# Altium integrated library 刘兴达Lib.IntLib: 614 symbols (part 1 of 4) (continued)
## EE-SX3081 (continued)
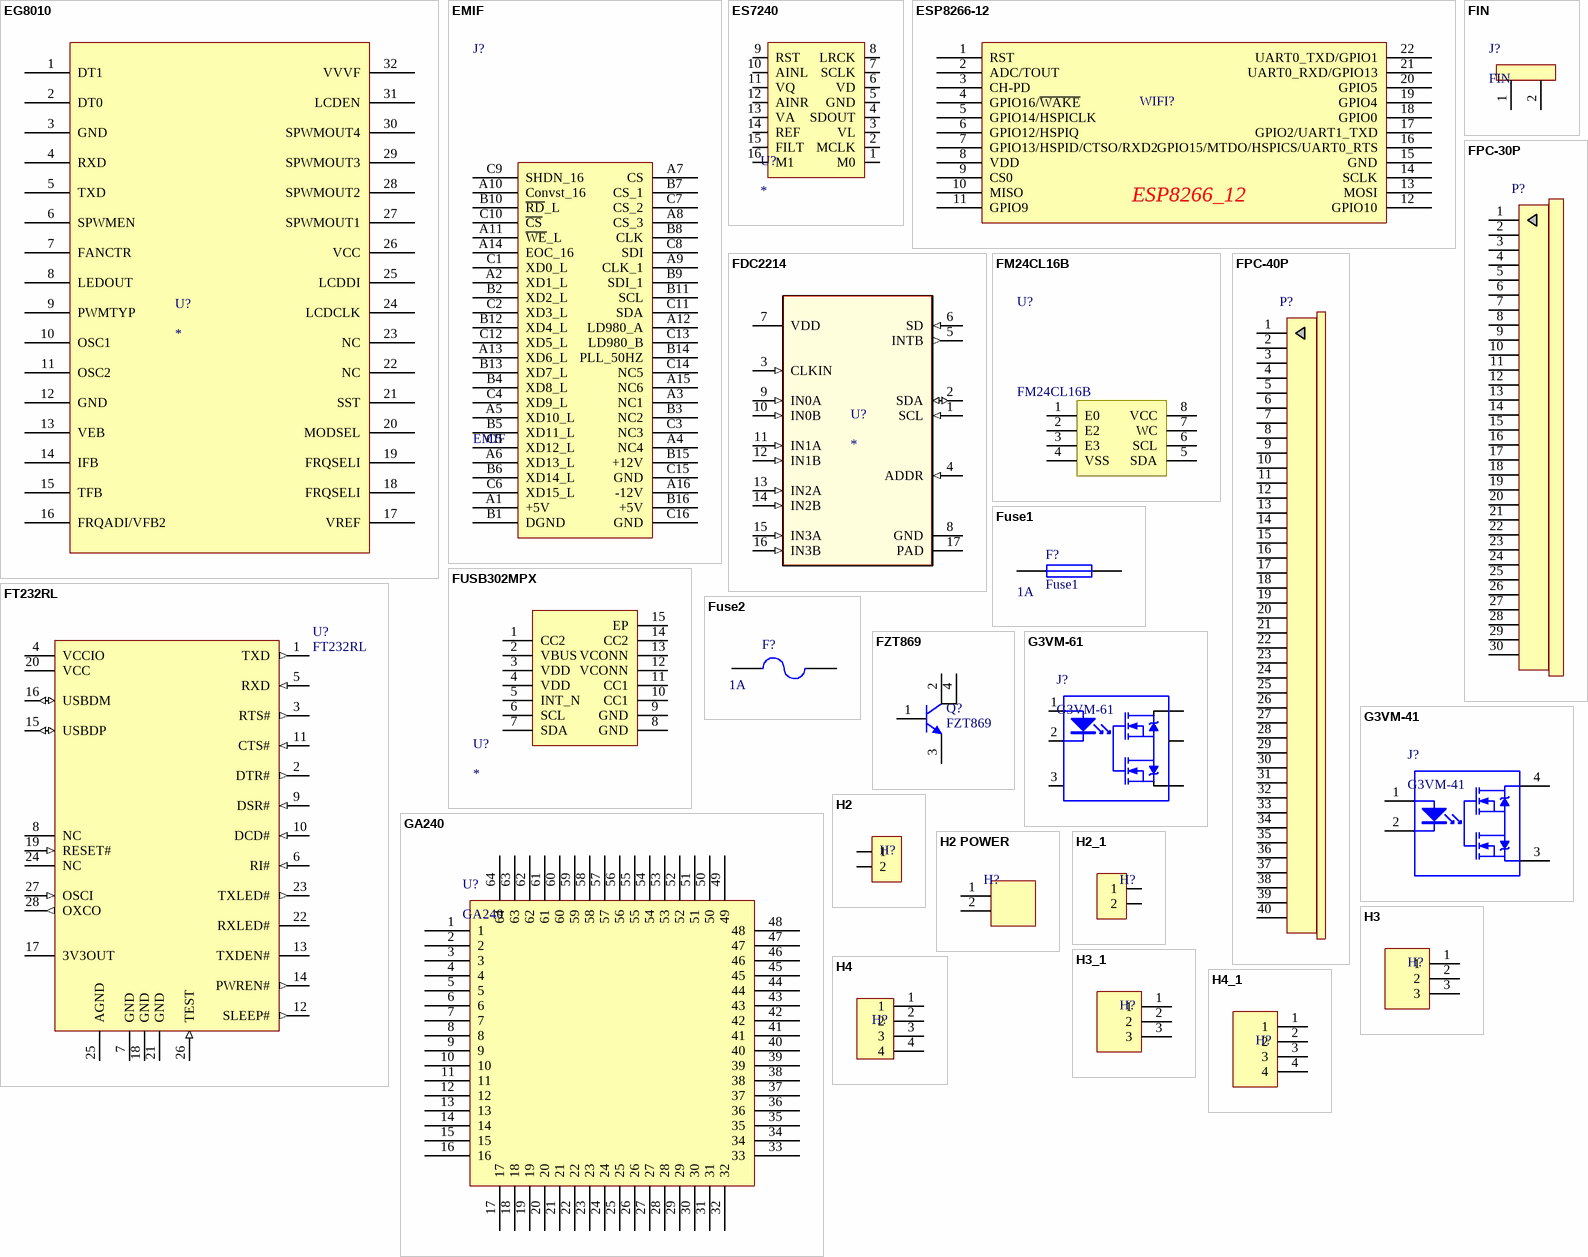
[diagram p6: symbols EG8010 to H4_1]

## EG8010
designator U?
单相逆变器控制器
footprint LQFP-32
pins: 1 DT1, 2 DT0, 3 GND, 4 RXD, 5 TXD, 6 SPWMEN, 7 FANCTR, 8 LEDOUT, 9 PWMTYP, 10 OSC1, 11 OSC2, 12 GND, 13 VEB, 14 IFB, 15 TFB, 16 FRQADI/VFB2, 17 VREF, 18 FRQSELI, 19 FRQSELI, 20 MODSEL, 21 SST, 22 NC, 23 NC, 24 LCDCLK, 25 LCDDI, 26 VCC, 27 SPWMOUT1, 28 SPWMOUT2, 29 SPWMOUT3, 30 SPWMOUT4, 31 LCDEN, 32 VVVF

## EMIF
designator J?
接插件
footprint HDR16X3_HA
footprint HDR16X3_HB
pins: A1 +5V, A2 XD1_L, A3 NC1, A4 NC4, A5 XD10_L, A6 XD13_L, A7 CS, A8 CS_3, A9 CLK_1, A10 Convst_16, A11 ~{WE}_L, A12 LD980_A, A13 XD6_L, A14 EOC_16, A15 NC6, A16 -12V, B1 DGND, B2 XD2_L, B3 NC2, B4 XD8_L, B5 XD11_L, B6 XD14_L, B7 CS_1, B8 CLK, B9 SDI_1, B10 ~{RD}_L, B11 SCL, B12 XD4_L, B13 XD7_L, B14 PLL_50HZ, B15 +12V, B16 +5V, C1 XD0_L, C2 XD3_L, C3 NC3, C4 XD9_L, C5 XD12_L, C6 XD15_L, C7 CS_2, C8 SDI, C9 SHDN_16, C10 ~{CS}, C11 SDA, C12 XD5_L, C13 LD980_B, C14 NC5, C15 GND, C16 GND

## ES7240
designator U?
音频解码芯片
footprint TSSOP-16 (TSOP, 16-Leads, Body 5x4.4mm, Pitch 0.65mm, IPC Low Density)
pins: 1 M0, 2 MCLK, 3 VL, 4 SDOUT, 5 GND, 6 VD, 7 SCLK, 8 LRCK, 9 RST, 10 AINL, 11 VQ, 12 AINR, 13 VA, 14 REF, 15 FILT, 16 M1

## ESP8266-12
designator WIFI?  (value not drawn)
footprint ESP8266-12
pins: 1 RST, 2 ADC/TOUT, 3 CH-PD, 4 GPIO16/~{WAKE}, 5 GPIO14/HSPICLK, 6 GPIO12/HSPIQ, 7 GPIO13/HSPID/CTSO/RXD2, 8 VDD, 9 CS0, 10 MISO, 11 GPIO9, 12 GPIO10, 13 MOSI, 14 SCLK, 15 GND, 16 GPIO15/MTDO/HSPICS/UART0_RTS, 17 GPIO2/UART1_TXD, 18 GPIO0, 19 GPIO4, 20 GPIO5, 21 UART0_RXD/GPIO13, 22 UART0_TXD/GPIO1
text: ESP8266_12

## FDC2214
designator U?
电容测量; PartNumber: FDC2214RGHR; Manufacturer: Texas Instruments; CompType: IC; PIN_COUNT: 17; Application_BuildNumber: *; Alternate_PartNumber: FDC2214RGHR; PackageReference: RGH0016A; MountType: SMT; RoHS: Y; RefDes: RefDes; TYPE: TYPE; Value: Value
footprint WQFN-16
pins: 1 SCL (in), 2 SDA (io), 3 CLKIN (in), 4 ADDR (in), 5 INTB (out), 6 SD (in), 7 VDD (power), 8 GND (power), 9 IN0A (in), 10 IN0B (in), 11 IN1A (in), 12 IN1B (in), 13 IN2A (in), 14 IN2B (in), 15 IN3A (in), 16 IN3B (in), 17 PAD (power)

## FIN
designator J?
散热片
footprint FIN-P2
pins: 1, 2

## FM24CL16B
designator U?
铁电存储器
footprint SOIC-8
pins: 1 E0, 2 E2, 3 E3, 4 VSS, 5 SDA, 6 SCL, 7 WC, 8 VCC

## FPC-30P
designator P?, comment FPC  (value not drawn)
FPC排线连接器
footprint FPC0.8-30P-A (FPC0.8mm接口)
pins: 1, 2, 3, 4, 5, 6, 7, 8, 9, 10, 11, 12, 13, 14, 15, 16, 17, 18, 19, 20, 21, 22, 23, 24, 25, 26, 27, 28, 29, 30

## FPC-40P
designator P?, comment FPC  (value not drawn)
FPC排线连接器
footprint FPC0.5-40P-A
pins: 1, 2, 3, 4, 5, 6, 7, 8, 9, 10, 11, 12, 13, 14, 15, 16, 17, 18, 19, 20, 21, 22, 23, 24, 25, 26, 27, 28, 29, 30, 31, 32, 33, 34, 35, 36, 37, 38, 39, 40

## FT232RL
designator U?
USB转串口; Published: 6-Oct-2005; LatestRevisionDate: 13-Apr-2006; LatestRevisionNote: IPC-7351 Footprint Added.; DatasheetVersion: ver 1.7, Feb-2005; PackageVersion: Mar-2004; PackageReference: LQFP-32; Publisher: Altium Limited; PackageDescription: 32-Pin Thin Quad Flat Pack 0.8 mm Pitch; ComponentLink1Description: Manufacturer Link; ComponentLink1URL: http://www.ftdichip.com/Products/FT232BM.htm; ComponentLink2Description: Datasheet; ComponentLink2URL: http://www.ftdichip.com/Documents/DataSheets/ds232b17.pdf
footprint SSOP-28 (FT232)
pins: 1 TXD (out), 2 DTR# (out), 3 RTS# (out), 4 VCCIO (power), 5 RXD (in), 6 RI# (in), 7 GND (power), 8 NC, 9 DSR# (in), 10 DCD# (in), 11 CTS# (in), 12 SLEEP# (out), 13 TXDEN# (oc), 14 PWREN# (out), 15 USBDP (io), 16 USBDM (io), 17 3V3OUT (power), 18 GND (power), 19 RESET# (in), 20 VCC (power), 21 GND (power), 22 RXLED# (oc), 23 TXLED# (out), 24 NC, 25 AGND (power), 26 TEST (in), 27 OSCI (in), 28 OXCO (out)

## FUSB302MPX
designator U?
footprint MLP-14 (14引脚的小芯片)
pins: 1 CC2, 2 VBUS, 3 VDD, 4 VDD, 5 INT_N, 6 SCL, 7 SDA, 8 GND, 9 GND, 10 CC1, 11 CC1, 12 VCONN, 13 VCONN, 14 CC2, 15 EP

## Fuse1
designator F?  value 1A
保险丝
pins: 1, 2

## Fuse2
designator F?  value 1A  (hidden comment: Fuse2)
可恢复保险丝; Published: 8-Jun-2000; LatestRevisionDate: 17-Jul-2002; LatestRevisionNote: Re-released for DXP Platform.; PackageReference: PIN-W2/E2.8; Publisher: Altium Limited
footprint 1812 (3.5A保险丝)
pins: 1, 2

## FZT869
designator Q?
NPN三极管; Published: 8-Jun-2000; LatestRevisionDate: 15-Jan-2003; LatestRevisionNote: PCB Footprint 'BCY-W3/D4.7' replaced; DatasheetDocument: 1997; PackageDocument: Sep-1998; PackageReference: TO-92A; Publisher: Altium Limited; Code_JEDEC: TO-92A; ComponentLink1Description: Manufacturer Link; ComponentLink1URL: http://www.fairchildsemi.com/; ComponentLink2Description: Datasheet; ComponentLink2URL: http://www.fairchildsemi.com/ds/2N%2F2N3904.pdf
footprint SOT223
pins: 1 B, 2 C, 3 E, 4 C

## G3VM-41
designator J?
固态继电器
footprint SMD-4 (继电器)
pins: 1 A "Anode", 2 K "Cathode", 3, 4

## G3VM-61
designator J?
固态继电器
footprint SMD-6 (继电器)
pins: 1 A "Anode", 2 K "Cathode", 3, 4, 5, 6

## GA240
designator U?
Freescale16位单片机
footprint LQFP-64 (LQFP)
pins: 1, 2, 3, 4, 5, 6, 7, 8, 9, 10, 11, 12, 13, 14, 15, 16, 17, 18, 19, 20, 21, 22, 23, 24, 25, 26, 27, 28, 29, 30, 31, 32, 33, 34, 35, 36, 37, 38, 39, 40, 41, 42, 43, 44, 45, 46, 47, 48, 49, 50, 51, 52, 53, 54, 55, 56, 57, 58, 59, 60, 61, 62, 63, 64

## H2
designator H?  (value not drawn)
排针
footprint H2 (排针)
footprint H2_WHITE (小白头)
pins: 1, 2

## H2 POWER
designator H?  (value not drawn)
footprint H2 POWER
pins: 1, 2

## H2_1
designator H?  (value not drawn)
footprint 15EDGVM-2P
footprint 15EDGRM-2P
footprint KF301-2
pins: 1, 2

## H3
designator H?  (value not drawn)
排针
footprint H3 (排针)
footprint H3_WHITE (小白头)
pins: 1, 2, 3

## H3_1
designator H?  (value not drawn)
footprint 15EDGVM-3P
footprint 15EDGRM-3P
pins: 1, 2, 3

## H4
designator H?  (value not drawn)
排针
footprint H4 (排针)
footprint H4_WHITE (小白头)
pins: 1, 2, 3, 4

## H4_1
designator H?  (value not drawn)
footprint 15EDGVM-4P
footprint 15EDGRM-4P
pins: 1, 2, 3, 4

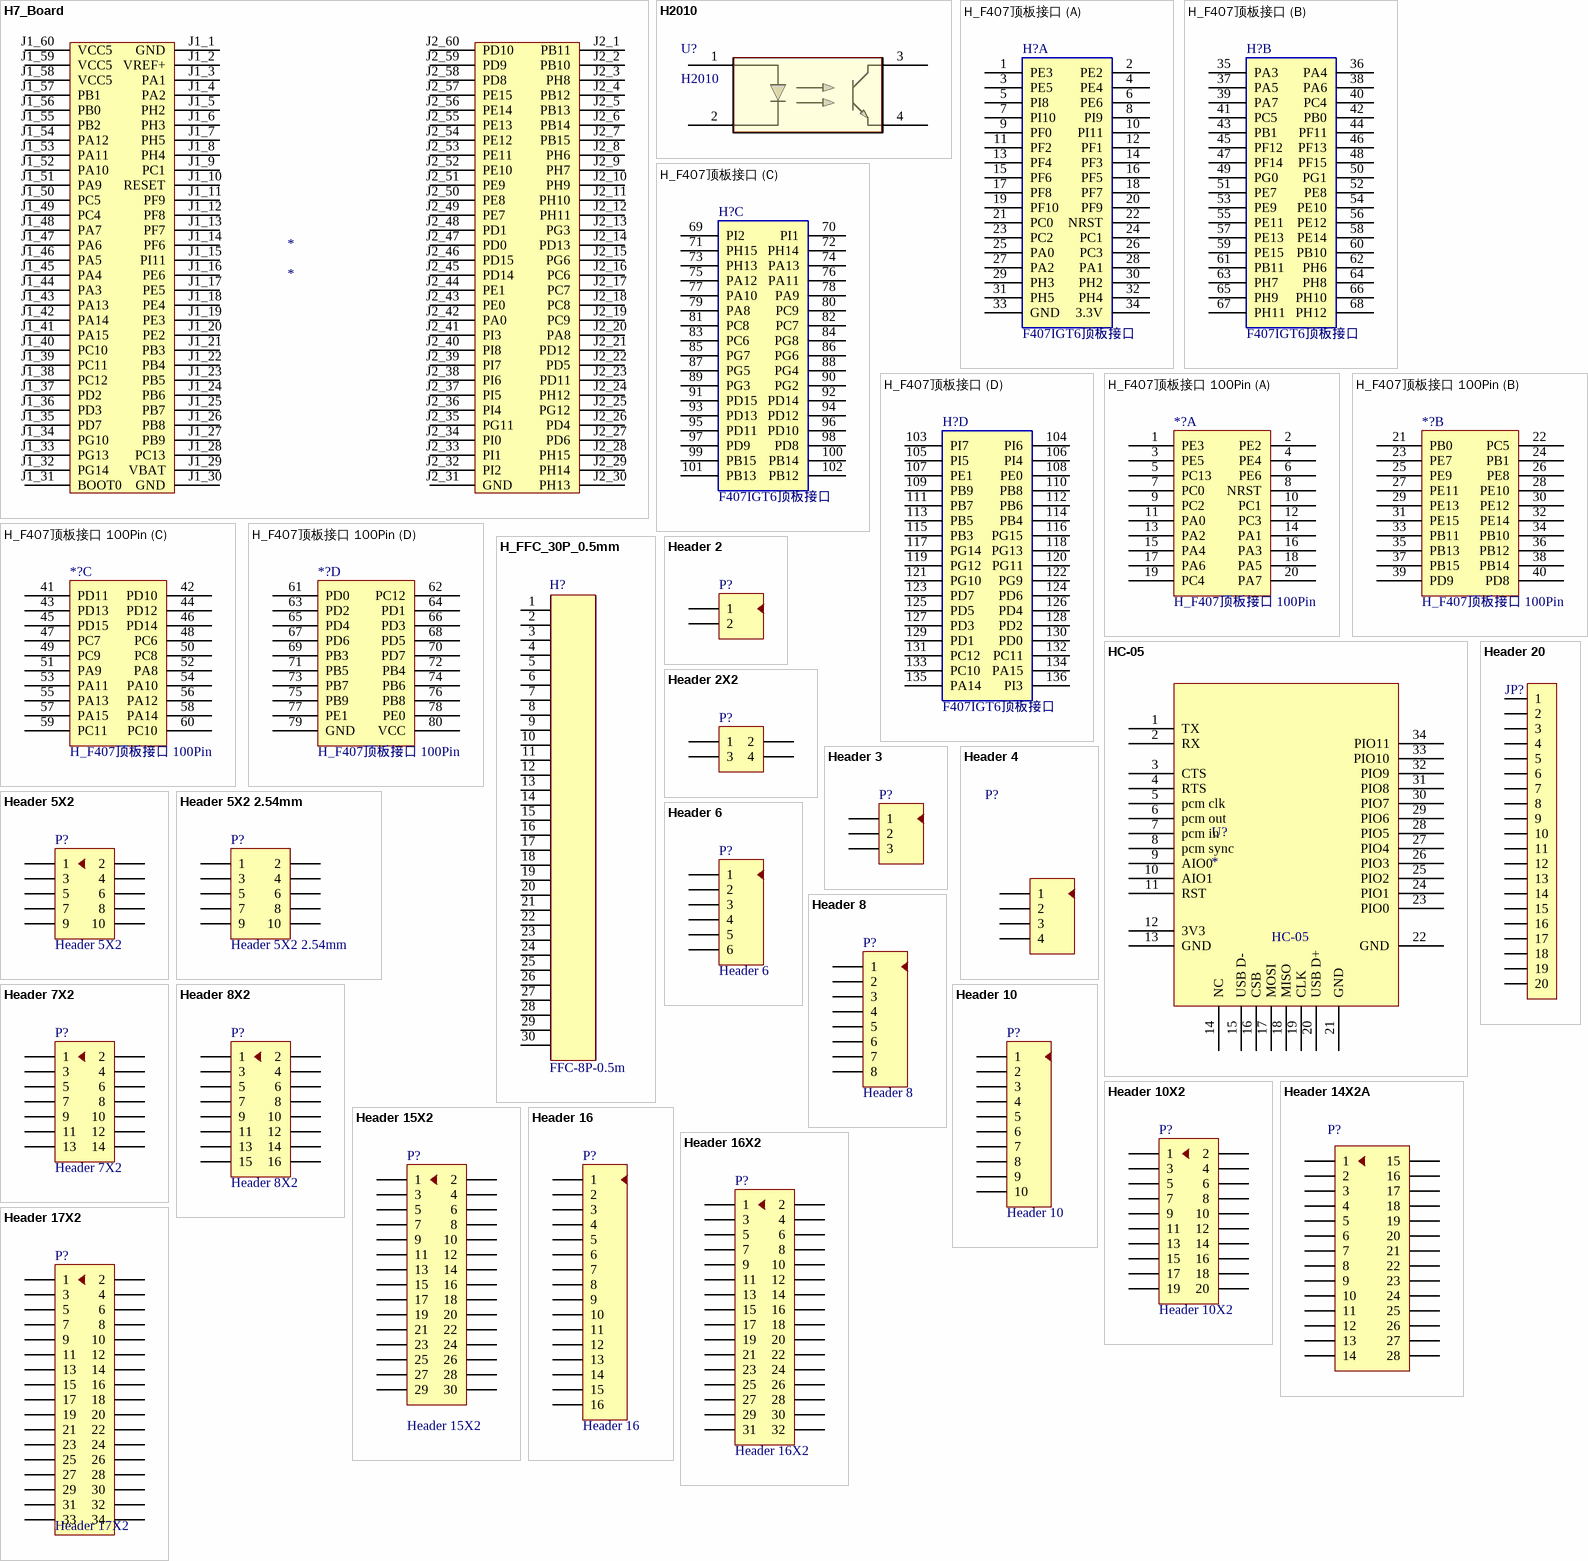
[diagram p7: symbols H7_Board to Header 20]

## H7_Board
designator *
footprint H7_Board
pins: J1_1 GND, J1_2 VREF+, J1_3 PA1, J1_4 PA2, J1_5 PH2, J1_6 PH3, J1_7 PH5, J1_8 PH4, J1_9 PC1, J1_10 RESET, J1_11 PF9, J1_12 PF8, J1_13 PF7, J1_14 PF6, J1_15 PI11, J1_16 PE6, J1_17 PE5, J1_18 PE4, J1_19 PE3, J1_20 PE2, J1_21 PB3, J1_22 PB4, J1_23 PB5, J1_24 PB6, J1_25 PB7, J1_26 PB8, J1_27 PB9, J1_28 PC13, J1_29 VBAT, J1_30 GND, J1_31 BOOT0, J1_32 PG14, J1_33 PG13, J1_34 PG10, J1_35 PD7, J1_36 PD3, J1_37 PD2, J1_38 PC12, J1_39 PC11, J1_40 PC10, J1_41 PA15, J1_42 PA14, J1_43 PA13, J1_44 PA3, J1_45 PA4, J1_46 PA5, J1_47 PA6, J1_48 PA7, J1_49 PC4, J1_50 PC5, J1_51 PA9, J1_52 PA10, J1_53 PA11, J1_54 PA12, J1_55 PB2, J1_56 PB0, J1_57 PB1, J1_58 VCC5, J1_59 VCC5, J1_60 VCC5, J2_1 PB11, J2_2 PB10, J2_3 PH8, J2_4 PB12, J2_5 PB13, J2_6 PB14, J2_7 PB15, J2_8 PH6, J2_9 PH7, J2_10 PH9, J2_11 PH10, J2_12 PH11, J2_13 PG3, J2_14 PD13, J2_15 PG6, J2_16 PC6, J2_17 PC7, J2_18 PC8, J2_19 PC9, J2_20 PA8, J2_21 PD12, J2_22 PD5, J2_23 PD11, J2_24 PH12, J2_25 PG12, J2_26 PD4, J2_27 PD6, J2_28 PH15, J2_29 PH14, J2_30 PH13, J2_31 GND, J2_32 PI2, J2_33 PI1, J2_34 PI0, J2_35 PG11, J2_36 PI4, J2_37 PI5, J2_38 PI6, J2_39 PI7, J2_40 PI8, J2_41 PI3, J2_42 PA0, J2_43 PE0, J2_44 PE1, J2_45 PD14, J2_46 PD15, J2_47 PD0, J2_48 PD1, J2_49 PE7, J2_50 PE8, J2_51 PE9, J2_52 PE10, J2_53 PE11, J2_54 PE12, J2_55 PE13, J2_56 PE14, J2_57 PE15, J2_58 PD8, J2_59 PD9, J2_60 PD10

## H2010
designator U?
槽型光耦; Manufacturer_Part_Number: TLP291(SE; Vendor: Toshiba; Copyright: Copyright (C) 2018 Accelerated Designs. All rights reserved; RefDes: RefDes; Type: DEV; Value: Value
footprint H2010
pins: 1, 2, 3 C, 4

## H_F407顶板接口
designator H?, comment F407IGT6顶板接口
footprint H_F407IGT6顶板接口
part A pins: 1 PE3, 2 PE2, 3 PE5, 4 PE4, 5 PI8, 6 PE6, 7 PI10, 8 PI9, 9 PF0, 10 PI11, 11 PF2, 12 PF1, 13 PF4, 14 PF3, 15 PF6, 16 PF5, 17 PF8, 18 PF7, 19 PF10, 20 PF9, 21 PC0, 22 NRST, 23 PC2, 24 PC1, 25 PA0, 26 PC3, 27 PA2, 28 PA1, 29 PH3, 30 PH2, 31 PH5, 32 PH4, 33 GND, 34 3.3V
part B pins: 35 PA3, 36 PA4, 37 PA5, 38 PA6, 39 PA7, 40 PC4, 41 PC5, 42 PB0, 43 PB1, 44 PF11, 45 PF12, 46 PF13, 47 PF14, 48 PF15, 49 PG0, 50 PG1, 51 PE7, 52 PE8, 53 PE9, 54 PE10, 55 PE11, 56 PE12, 57 PE13, 58 PE14, 59 PE15, 60 PB10, 61 PB11, 62 PH6, 63 PH7, 64 PH8, 65 PH9, 66 PH10, 67 PH11, 68 PH12
part C pins: 69 PI2, 70 PI1, 71 PH15, 72 PH14, 73 PH13, 74 PA13, 75 PA12, 76 PA11, 77 PA10, 78 PA9, 79 PA8, 80 PC9, 81 PC8, 82 PC7, 83 PC6, 84 PG8, 85 PG7, 86 PG6, 87 PG5, 88 PG4, 89 PG3, 90 PG2, 91 PD15, 92 PD14, 93 PD13, 94 PD12, 95 PD11, 96 PD10, 97 PD9, 98 PD8, 99 PB15, 100 PB14, 101 PB13, 102 PB12
part D pins: 103 PI7, 104 PI6, 105 PI5, 106 PI4, 107 PE1, 108 PE0, 109 PB9, 110 PB8, 111 PB7, 112 PB6, 113 PB5, 114 PB4, 115 PB3, 116 PG15, 117 PG14, 118 PG13, 119 PG12, 120 PG11, 121 PG10, 122 PG9, 123 PD7, 124 PD6, 125 PD5, 126 PD4, 127 PD3, 128 PD2, 129 PD1, 130 PD0, 131 PC12, 132 PC11, 133 PC10, 134 PA15, 135 PA14, 136 PI3

## H_F407顶板接口 100Pin
designator *?
footprint H_F407顶板接口100Pin
part A pins: 1 PE3, 2 PE2, 3 PE5, 4 PE4, 5 PC13, 6 PE6, 7 PC0, 8 NRST, 9 PC2, 10 PC1, 11 PA0, 12 PC3, 13 PA2, 14 PA1, 15 PA4, 16 PA3, 17 PA6, 18 PA5, 19 PC4, 20 PA7
part B pins: 21 PB0, 22 PC5, 23 PE7, 24 PB1, 25 PE9, 26 PE8, 27 PE11, 28 PE10, 29 PE13, 30 PE12, 31 PE15, 32 PE14, 33 PB11, 34 PB10, 35 PB13, 36 PB12, 37 PB15, 38 PB14, 39 PD9, 40 PD8
part C pins: 41 PD11, 42 PD10, 43 PD13, 44 PD12, 45 PD15, 46 PD14, 47 PC7, 48 PC6, 49 PC9, 50 PC8, 51 PA9, 52 PA8, 53 PA11, 54 PA10, 55 PA13, 56 PA12, 57 PA15, 58 PA14, 59 PC11, 60 PC10
part D pins: 61 PD0, 62 PC12, 63 PD2, 64 PD1, 65 PD4, 66 PD3, 67 PD6, 68 PD5, 69 PB3, 70 PD7, 71 PB5, 72 PB4, 73 PB7, 74 PB6, 75 PB9, 76 PB8, 77 PE1, 78 PE0, 79 GND, 80 VCC

## H_FFC_30P_0.5mm
designator H?, comment FFC-8P-0.5m
footprint H_FFC-30P-0.5 (间距0.5mm 30P)
pins: 1, 2, 3, 4, 5, 6, 7, 8, 9, 10, 11, 12, 13, 14, 15, 16, 17, 18, 19, 20, 21, 22, 23, 24, 25, 26, 27, 28, 29, 30

## HC-05
designator U?
蓝牙
footprint HC-05
pins: 1 TX, 2 RX, 3 CTS, 4 RTS, 5 pcm clk, 6 pcm out, 7 pcm in, 8 pcm sync, 9 AIO0, 10 AIO1, 11 RST, 12 3V3, 13 GND, 14 NC, 15 USB D-, 16 CSB, 17 MOSI, 18 MISO, 19 CLK, 20 USB D+, 21 GND, 22 GND, 23 PIO0, 24 PIO1, 25 PIO2, 26 PIO3, 27 PIO4, 28 PIO5, 29 PIO6, 30 PIO7, 31 PIO8, 32 PIO9, 33 PIO10, 34 PIO11

## Header 2
designator P?  (value not drawn)
接插件; LatestRevisionDate: 17-Jul-2002; LatestRevisionNote: Re-released for DXP Platform.; Publisher: Altium Limited
footprint KF2.54-2P (KF2.54端子)
footprint HDR2X1-2.54 (2.54单排针排座)
footprint XH2.54-2PH (XH2.54端子弯针)
footprint XH2.54-2P (XH2.54端子直针)
footprint EDSTLZ1550-2P (3.81mm接插件)
footprint KF7.62-2P (KF7.62端子)
pins: 1, 2

## Header 2X2
designator P?  (value not drawn)
接插件; LatestRevisionDate: 17-Jul-2002; LatestRevisionNote: Re-released for DXP Platform.; Publisher: Altium Limited
footprint HDR2X2-2.54 (2.54双排针排座)
pins: 1, 2, 3, 4

## Header 3
designator P?  (value not drawn)
接插件; LatestRevisionDate: 17-Jul-2002; LatestRevisionNote: Re-released for DXP Platform.; Publisher: Altium Limited
footprint XH2.54-3P (XH2.54端子直针)
footprint HDR3X1-2.54 (2.54单排针排座)
footprint KF2EDG5.08 (5.08mm端子)
footprint KF2EDG5.08H (5.08mm端子)
footprint VH3.96-3P (VH3.96接插件)
footprint EDSTLZ1550-3P (3.81mm接插件)
footprint KF2.54-3P (KF2.54端子)
pins: 1, 2, 3

## Header 4
designator P?  (value not drawn)
接插件; LatestRevisionDate: 17-Jul-2002; LatestRevisionNote: Re-released for DXP Platform.; Publisher: Altium Limited
footprint XH2.54-4P (XH2.54端子直针)
footprint XH2.54-4PH (XH2.54端子弯针)
footprint EDSTLZ1550-4P (3.81mm接插件)
footprint PH1.25-4P (PH1.25端子)
footprint HDR4X1-2.54 (2.54单排针排座)
pins: 1, 2, 3, 4

## Header 5X2
designator P?
接插件; LatestRevisionDate: 17-Jul-2002; LatestRevisionNote: Re-released for DXP Platform.; Publisher: Altium Limited
footprint HDR5X2-2.54 (2.54双排针排座)
footprint DC3-10P-2.0mm (简易牛角座直)
footprint DC3-10P-2.54mm (简易牛角座直)
footprint DC3-10PL-2.54mm (简易牛角座弯)
pins: 1, 2, 3, 4, 5, 6, 7, 8, 9, 10

## Header 5X2 2.54mm
designator P?
LatestRevisionDate: 17-Jul-2002; LatestRevisionNote: Re-released for DXP Platform.; Publisher: Altium Limited
footprint H_DC3_10
pins: 1, 2, 3, 4, 5, 6, 7, 8, 9, 10

## Header 6
designator P?
接插件; LatestRevisionDate: 17-Jul-2002; LatestRevisionNote: Re-released for DXP Platform.; Publisher: Altium Limited
footprint VH3.96-6P (CH3.96接插件)
footprint HDR6X1-2.54 (2.54单排针排座)
pins: 1, 2, 3, 4, 5, 6

## Header 7X2
designator P?
接插件; LatestRevisionDate: 17-Jul-2002; LatestRevisionNote: Re-released for DXP Platform.; Publisher: Altium Limited
footprint HDR7X2-2.54 (2.54双排针排座)
footprint DC3-14P-2.54mm (简易牛角座直)
footprint DC3-14P-2.0mm (简易牛角座直)
pins: 1, 2, 3, 4, 5, 6, 7, 8, 9, 10, 11, 12, 13, 14

## Header 8
designator P?
接插件; LatestRevisionDate: 17-Jul-2002; LatestRevisionNote: Re-released for DXP Platform.; Publisher: Altium Limited
footprint PH2.0-8P (PH2.0端子)
pins: 1, 2, 3, 4, 5, 6, 7, 8

## Header 8X2
designator P?
接插件; LatestRevisionDate: 17-Jul-2002; LatestRevisionNote: Re-released for DXP Platform.; Publisher: Altium Limited
footprint HDR8X2-2.54 (2.54双排针排座)
footprint HDR8X2_E1
footprint DC3-16PL-2.54MM (2.54双排针排座)
footprint DC3-16P-2.54mm (简易牛角座直)
pins: 1, 2, 3, 4, 5, 6, 7, 8, 9, 10, 11, 12, 13, 14, 15, 16

## Header 10
designator P?
接插件; LatestRevisionDate: 17-Jul-2002; LatestRevisionNote: Re-released for DXP Platform.; Publisher: Altium Limited
footprint PH2.0-10P
pins: 1, 2, 3, 4, 5, 6, 7, 8, 9, 10

## Header 10X2
designator P?
接插件; LatestRevisionDate: 17-Jul-2002; LatestRevisionNote: Re-released for DXP Platform.; Publisher: Altium Limited
footprint HDR10X2-2.54 (2.54双排针排座)
footprint DC3-20P-2.0mm (简易牛角座直)
footprint DC3-20P-2.54mm (简易牛角座直)
pins: 1, 2, 3, 4, 5, 6, 7, 8, 9, 10, 11, 12, 13, 14, 15, 16, 17, 18, 19, 20

## Header 14X2A
designator P?  (value not drawn)
接插件
footprint HDR14X2A-2.54 (2.54双排针排座)
pins: 1 (power), 2 (power), 3 (power), 4 (power), 5 (power), 6 (power), 7 (power), 8 (power), 9 (power), 10 (power), 11 (power), 12 (power), 13 (power), 14 (power), 15 (power), 16 (power), 17 (power), 18 (power), 19 (power), 20 (power), 21 (power), 22 (power), 23 (power), 24 (power), 25 (power), 26 (power), 27 (power), 28 (power)

## Header 15X2
designator P?
接插件; LatestRevisionDate: 17-Jul-2002; LatestRevisionNote: Re-released for DXP Platform.; Publisher: Altium Limited
footprint HDR15X2-2.54-SMD (2.54双排针排座)
footprint HDR15X2-2.54 (Connector; Header; 15x2 Position)
pins: 1, 2, 3, 4, 5, 6, 7, 8, 9, 10, 11, 12, 13, 14, 15, 16, 17, 18, 19, 20, 21, 22, 23, 24, 25, 26, 27, 28, 29, 30

## Header 16
designator P?
接插件; LatestRevisionDate: 17-Jul-2002; LatestRevisionNote: Re-released for DXP Platform.; Publisher: Altium Limited
footprint HDR16X1-2.54 (2.54单排针排座)
footprint FPC1.0-16P-A (FPC)
pins: 1, 2, 3, 4, 5, 6, 7, 8, 9, 10, 11, 12, 13, 14, 15, 16

## Header 16X2
designator P?
接插件; LatestRevisionDate: 17-Jul-2002; LatestRevisionNote: Re-released for DXP Platform.; Publisher: Altium Limited
footprint HDR16X2-2.54 (2.54双排针排座)
footprint DC3-32P-2.54MM (2.54简易牛角座)
pins: 1, 2, 3, 4, 5, 6, 7, 8, 9, 10, 11, 12, 13, 14, 15, 16, 17, 18, 19, 20, 21, 22, 23, 24, 25, 26, 27, 28, 29, 30, 31, 32

## Header 17X2
designator P?
接插件; LatestRevisionDate: 17-Jul-2002; LatestRevisionNote: Re-released for DXP Platform.; Publisher: Altium Limited
footprint DC3-34P-2.54MM (2.54简易牛角座)
pins: 1, 2, 3, 4, 5, 6, 7, 8, 9, 10, 11, 12, 13, 14, 15, 16, 17, 18, 19, 20, 21, 22, 23, 24, 25, 26, 27, 28, 29, 30, 31, 32, 33, 34

## Header 20
designator JP?, comment HDR-1X20  (value not drawn)
20P接插件; 联系卖家，免费查找封装: 唯一出售店铺网址https://shop463601444.taobao.com; 封装库来自淘宝卖家ID：黄晶宝石: 其他店铺购入均为盗版封装库，请立即申请退款，本店现金奖励50~200元; BOM名称: 20P接插件
footprint HDR2.54-LI-20P (排针，20脚)
pins: 1, 2, 3, 4, 5, 6, 7, 8, 9, 10, 11, 12, 13, 14, 15, 16, 17, 18, 19, 20

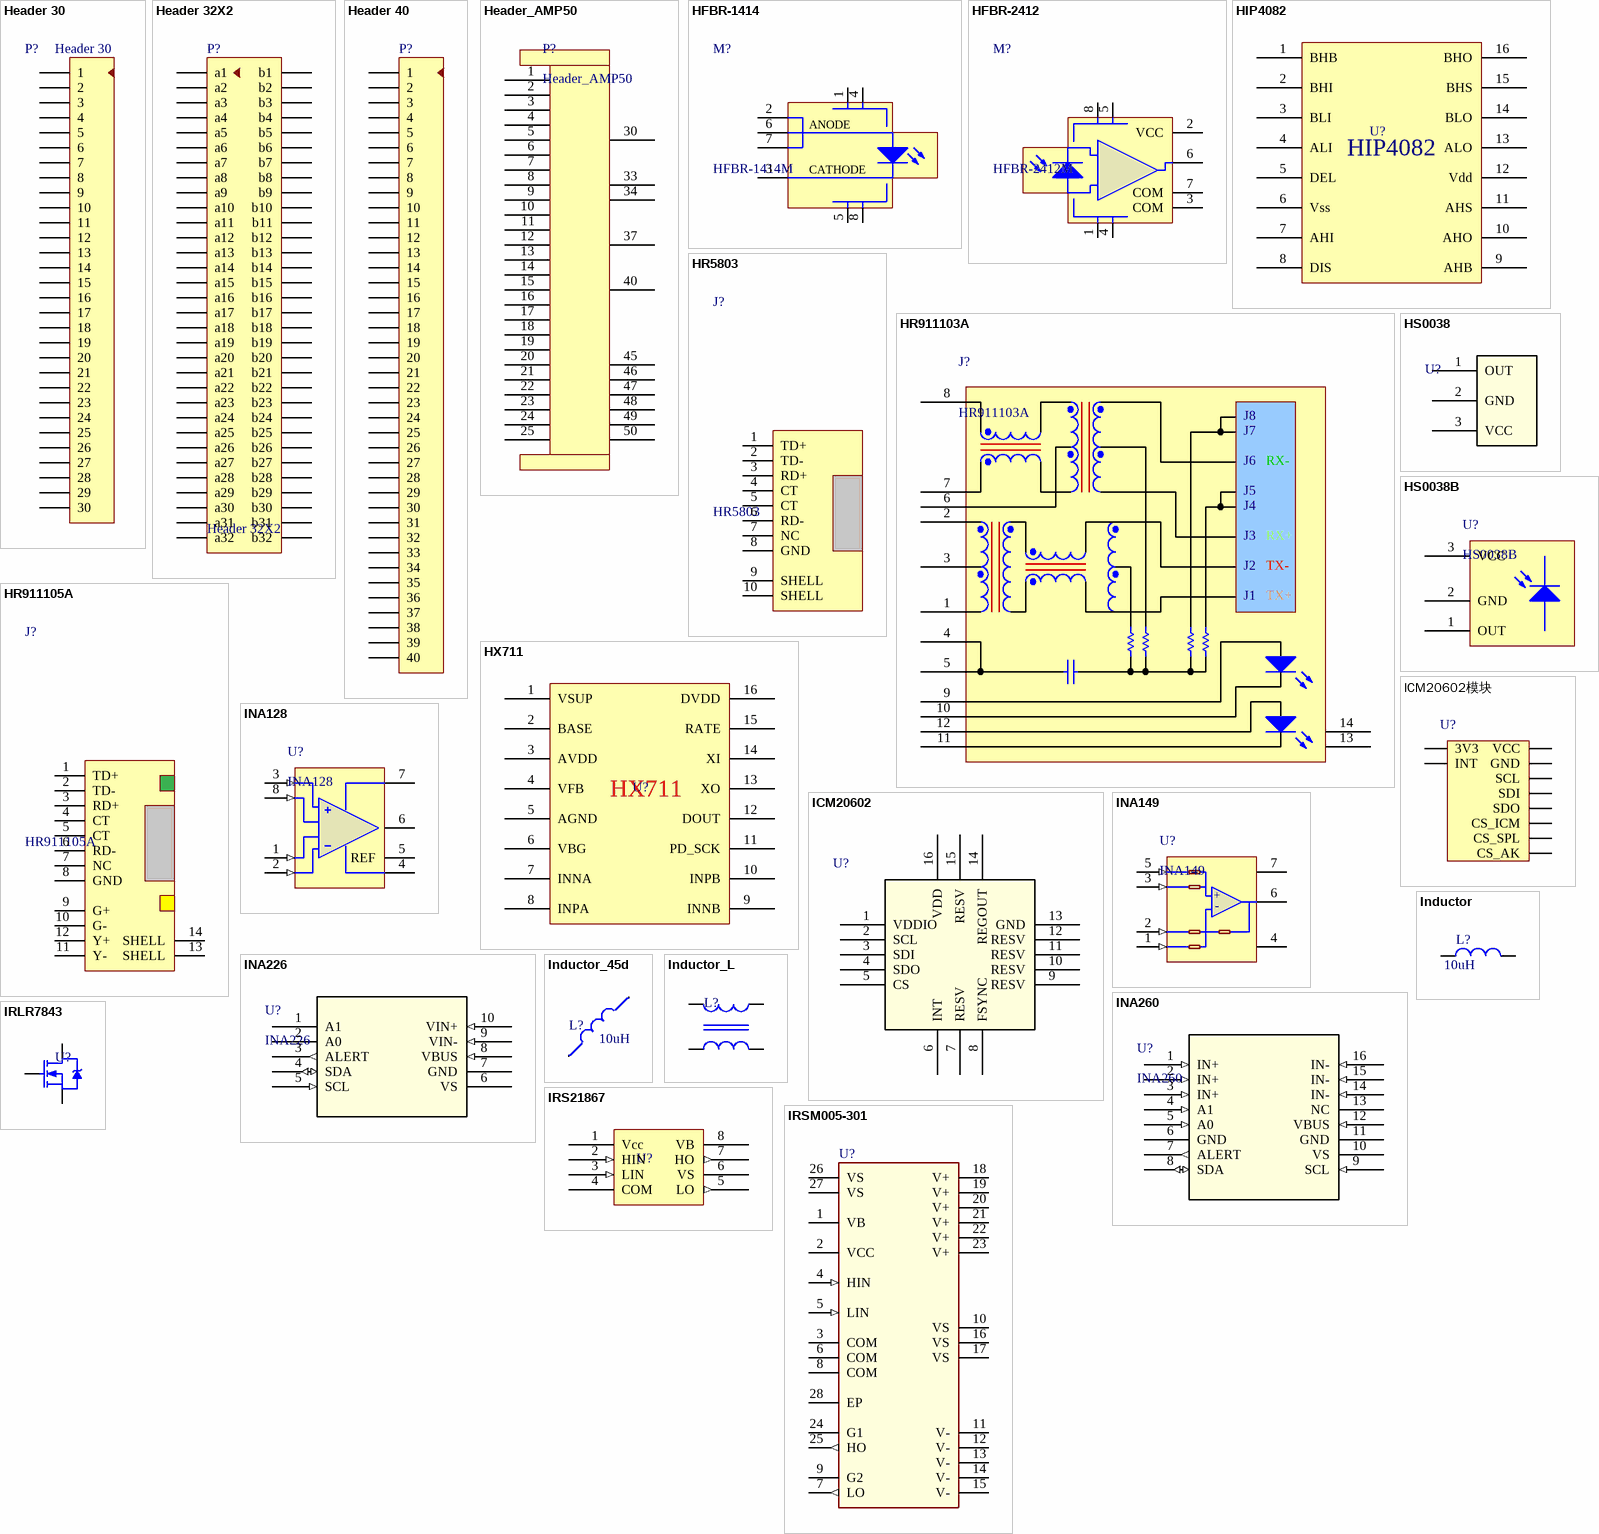
[diagram p8: symbols Header 30 to IRSM005-301]

## Header 30
designator P?
接插件; LatestRevisionDate: 17-Jul-2002; LatestRevisionNote: Re-released for DXP Platform.; Publisher: Altium Limited
footprint HDR30X1-2.54 (Connector; Header; 30 Position)
pins: 1, 2, 3, 4, 5, 6, 7, 8, 9, 10, 11, 12, 13, 14, 15, 16, 17, 18, 19, 20, 21, 22, 23, 24, 25, 26, 27, 28, 29, 30

## Header 32X2
designator P?
接插件; LatestRevisionDate: 17-Jul-2002; LatestRevisionNote: Re-released for DXP Platform.; Publisher: Altium Limited
footprint HDR32X2_HA (Connector; Header; 30x2 Position)
footprint HDR32X2_HB (Connector; Header; 30x2 Position)
pins: a1, a2, a3, a4, a5, a6, a7, a8, a9, a10, a11, a12, a13, a14, a15, a16, a17, a18, a19, a20, a21, a22, a23, a24, a25, a26, a27, a28, a29, a30, a31, a32, b1, b2, b3, b4, b5, b6, b7, b8, b9, b10, b11, b12, b13, b14, b15, b16, b17, b18, b19, b20, b21, b22, b23, b24, b25, b26, b27, b28, b29, b30, b31, b32

## Header 40
designator P?  (value not drawn)
接插件; LatestRevisionDate: 17-Jul-2002; LatestRevisionNote: Re-released for DXP Platform.; Publisher: Altium Limited
footprint HDR40X1-2.54 (2.54单排针排座)
pins: 1, 2, 3, 4, 5, 6, 7, 8, 9, 10, 11, 12, 13, 14, 15, 16, 17, 18, 19, 20, 21, 22, 23, 24, 25, 26, 27, 28, 29, 30, 31, 32, 33, 34, 35, 36, 37, 38, 39, 40

## Header_AMP50
designator P?
控制器接插件
footprint HDR25X2_H (控制器接插件)
pins: 1, 2, 3, 4, 5, 6, 7, 8, 9, 10, 11, 12, 13, 14, 15, 16, 17, 18, 19, 20, 21, 22, 23, 24, 25, 30, 33, 34, 37, 40, 45, 46, 47, 48, 49, 50

## HFBR-1414
designator M?, comment HFBR-1414M
光发送
footprint HFBR-X41XMZ
pins: 1 NC, 2 ANODE, 3 CATHODE, 4 NC, 5 NC, 6 ANODE, 7 ANODE, 8 NC

## HFBR-2412
designator M?, comment HFBR-2412M
光接收
footprint HFBR-X41XMZ
pins: 1 NC, 2 VCC, 3 COM, 4 NC, 5 NC, 6 DATA, 7 COM, 8 NC

## HIP4082
designator U?  (value not drawn)
MOS驱动
footprint HIP4082
pins: 1 BHB, 2 BHI, 3 BLI, 4 ALI, 5 DEL, 6 Vss, 7 AHI, 8 DIS, 9 AHB, 10 AHO, 11 AHS, 12 Vdd, 13 ALO, 14 BLO, 15 BHS, 16 BHO

## HR5803
designator J?
以太网接口
footprint RJ45-5803-10P8C
pins: 1 TD+, 2 TD-, 3 RD+, 4 CT, 5 CT, 6 RD-, 7 NC, 8 GND, 9 SHELL, 10 SHELL

## HR911103A
designator J?
网络接口; PackageDocument: 1988; Published: 24-Mar-1999; LatestRevisionDate: 17-Jul-2002; LatestRevisionNote: Re-released for DXP Platform.; PackageReference: 425; Publisher: Altium Limited
footprint RJ8-HR911103A (网线接口)
pins: 1 TD+, 2 TD-, 3 TD-, 4 TD-, 5 GND, 6 GND, 7 RD+, 8 RD-, 9 GLED+, 10 GLED-, 11 YLED-, 12 YLED+, 13, 14
text: J8; J7; J6; RX-; J5; J4; J3; RX+; J2; TX-; J1; TX+

## HR911105A
designator J?
以太网接口
footprint RJ8-HR911105B (网络)
footprint RJ8-HR911105A
pins: 1 TD+, 2 TD-, 3 RD+, 4 CT, 5 CT, 6 RD-, 7 NC, 8 GND, 9 G+, 10 G-, 11 Y-, 12 Y+, 13 SHELL, 14 SHELL

## HS0038
designator U?
红外接受头; Manufacturer_Part_Number: DS18B20+PAR; Vendor: Maxim Integrated Products; Built_By: EMA_UL_Team; Copyright: Copyright (C) 2018 Accelerated Designs. All rights reserved; RefDes: RefDes; Type: DEV; Value: Value
footprint TO-92
pins: 1 OUT (power), 2 GND, 3 VCC (power)

## HS0038B
designator U?
红外接收器
footprint HS0038B (红外接收头)
pins: 1 OUT, 2 GND, 3 VCC

## HX711
designator U?  (value not drawn)
电子秤专用模拟/数字（A/D）转换器芯片
footprint SOP-16
pins: 1 VSUP, 2 BASE, 3 AVDD, 4 VFB, 5 AGND, 6 VBG, 7 INNA, 8 INPA, 9 INNB, 10 INPB, 11 PD_SCK, 12 DOUT, 13 XO, 14 XI, 15 RATE, 16 DVDD

## ICM20602
designator U?
IMU; Manufacturer_Part_Number: AD835ARZ; Vendor: Vendor; Value: Value; Type: Type; RefDes: Refdes
footprint LGA-16
pins: 1 VDDIO, 2 SCL, 3 SDI (power), 4 SDO, 5 CS, 6 INT (power), 7 RESV, 8 FSYNC, 9 RESV, 10 RESV, 11 RESV, 12 RESV, 13 GND, 14 REGOUT, 15 RESV, 16 VDD

## ICM20602模块
designator U?
footprint ICM20602模块
pins: 1 VCC, 2 GND, 3 SCL, 4 SDI, 5 SDO, 6 CS_ICM, 7 CS_SPL, 8 CS_AK, 9 3V3, 10 INT

## INA128
designator U?
一般差分仪表放大器
footprint SOIC-8
pins: 1 RG (in), 2 IN- (in), 3 IN+ (in), 4 V-, 5 REF (power), 6 OUT, 7 V+, 8 RG (in)

## INA149
designator U?
差分运放
footprint SOIC-8
pins: 1 REFB (in), 2 IN- (in), 3 IN+ (in), 4 V-, 5 REFA (in), 6 OUT, 7 V+
text: +; -

## INA226
designator U?
直流功率计量; Manufacturer: Texas Instruments; Manufacturer_Part_Number: ina226_dgs_10; INDUSTRY_STD_PKG_TYPE: MSOP; FAMILY_NAME: CURRENT SHUNT MONITOR; PIN_COUNT: 10; PACKAGE_DESIGNATOR: DGS; Datasheet_URL: http://www.ti.com/lit/gpn/INA226; GENERIC_PART_NUMBER: INA226; Vendor: Texas Instruments; Value: Value; Type: Type; RefDes: RefDes
footprint MSOP-10
pins: 1 A1, 2 A0, 3 ALERT (out), 4 SDA (io), 5 SCL (in), 6 VS (power), 7 GND (power), 8 VBUS (in), 9 VIN- (in), 10 VIN+ (in)

## INA260
designator U?
直流功率计量; Manufacturer_Part_Number: INA260AIPW; Vendor: Texas Instruments; Built_By: EMA_Jessica; Copyright: Copyright (C) 2018 Accelerated Designs. All rights reserved; RefDes: RefDes; Type: DEV; Value: Value
footprint TSSOP-16
pins: 1 IN+ (in), 2 IN+ (in), 3 IN+ (in), 4 A1 (in), 5 A0 (in), 6 GND (power), 7 ALERT (out), 8 SDA (io), 9 SCL (in), 10 VS (power), 11 GND (power), 12 VBUS (in), 13 NC, 14 IN- (in), 15 IN- (in), 16 IN- (in)

## Inductor
designator L?  value 10uH  (hidden comment: Inductor)
电感; Code_IEC: 1005; Published: 8-Jun-2000; LatestRevisionDate: 17-Jul-2002; LatestRevisionNote: Re-released for DXP Platform.; PackageReference: 0402-A; Publisher: Altium Limited; Code_JEITA: 0402
footprint L-SMD-7 (贴片电感7*7)
footprint L-RB-8 (Inductor)
footprint 1206 (贴片元件)
footprint 0805-1 (贴片带丝印)
footprint L-RB-8F (直?)
footprint L-SMD-10 (贴片电感10*10)
footprint L-SMD-12 (贴片电感12*12)
footprint 0603-1 (0603带丝印)
footprint INDP3735
footprint L-SMD-3 (贴片电感3.8)
pins: 1, 2